# Altium footprint library PcbLib1_newsimcard.PcbLib: 28 footprints (part 2 of 2)
Each footprint in its own frame and in the unit in brackets; x right, y up, seen from the top. Pads: shape width x height; smd on the part's side, far side on the other; paste and mask are expansions set on the pad; w line width, h text height; cw(c..) or ccw(c..) is an arc to the next point about the centre after c.
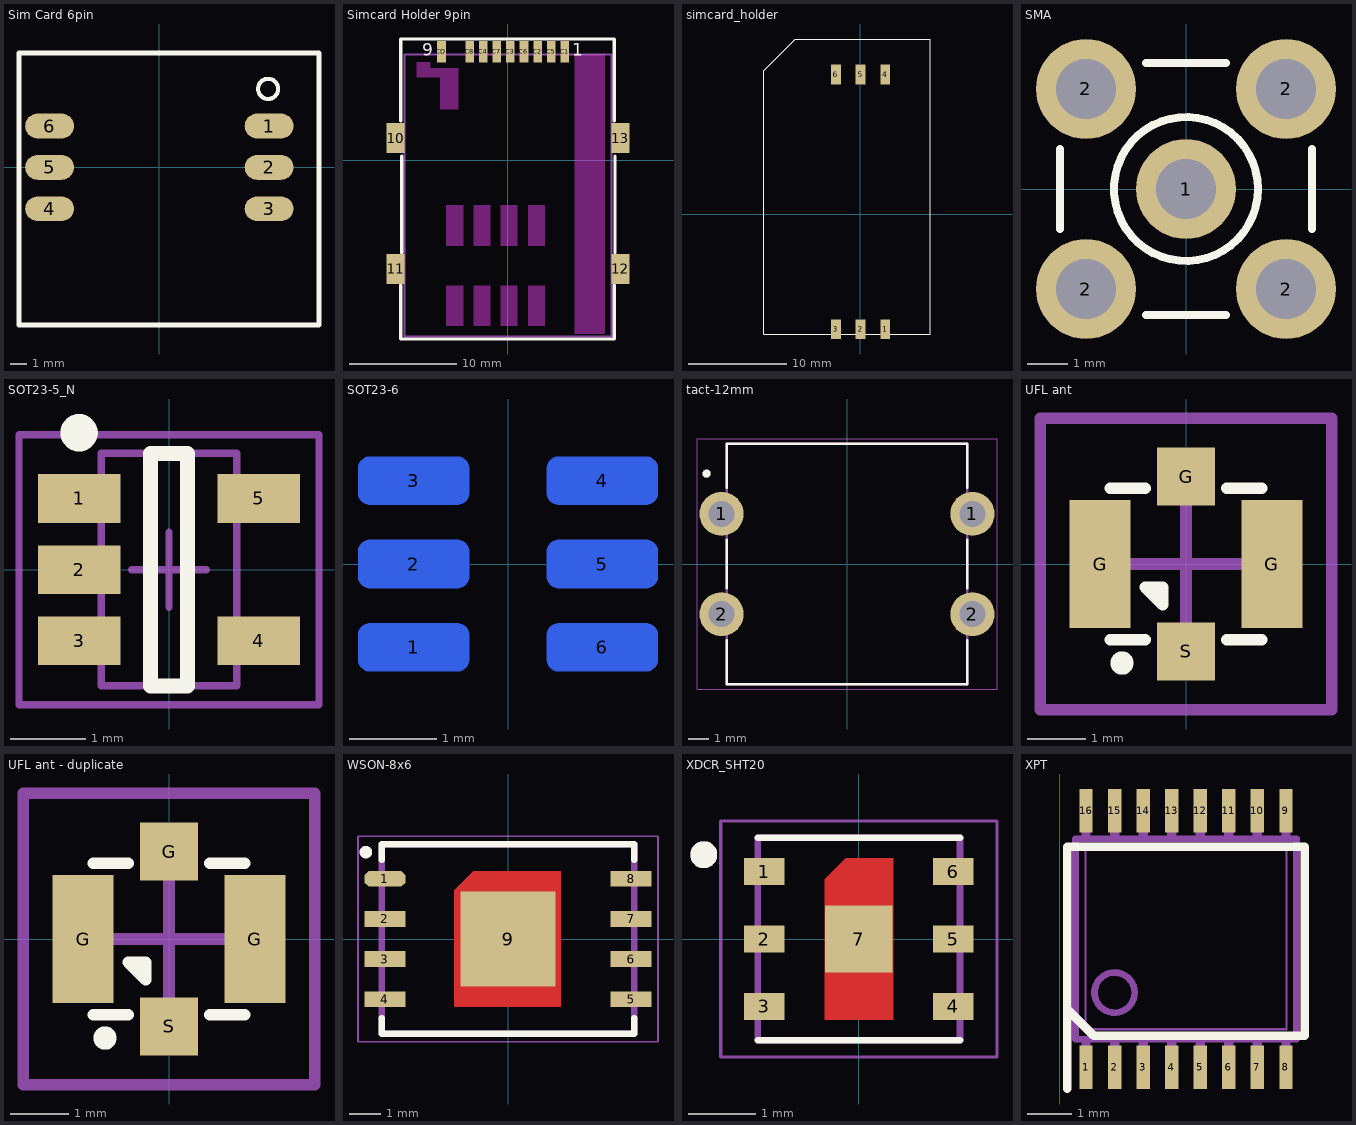
[diagram p1: the footprints below, top view; thin cyan lines are the x and y axes]

## Sim Card 6pin [mm]
pads (6):
  oval 3x1.524 smd: 1(6.74,2.54) 2(6.74,0) 3(6.74,-2.54) 4(-6.74,-2.54) 5(-6.74,0) 6(-6.74,2.54)
Top Overlay:
  circle w0.25: c6.68,4.823 r0.619
  lines w0.305: -8.62,-9.677 9.805,-9.677 9.805,7.023 -8.62,7.023 -8.62,-9.677
3D body "User Library-Sim Card Holder.STEP": height 1.8, standoff 0, extent -6.875,-9.55 9.425,6.85

## Simcard Holder 9pin [mm]
pads (13):
  rect 1.7x2.8 smd: 10(-10.5,2.075) 11(-10.5,-10.125) 12(10.5,-10.125) 13(10.5,2.075)
  rect 0.8x2 smd: C1(5.3,10.125) C2(2.76,10.125) C3(0.22,10.125) C4(-2.32,10.125) C5(4.03,10.125) C6(1.49,10.125) C7(-1.05,10.125) C8(-3.59,10.125) CD(-6.21,10.125)
Top Overlay:
  lines w0.3: -10,-11.625 -10,-16.675 9.925,-16.675 9.925,-11.625 ; -10,3.7 -10,11.325 9.925,11.325 9.925,3.7 ; -9.925,-8.625 -9.925,0.375 ; 10,-8.625 10,0.375
  text "9" at -8,9.325 h2
  text "1" at 6,9.325 h2
Keep-Out Layer:
  rectangle: -5.775,-7.975 -4.175,-4.175
  rectangle: -3.235,-7.975 -1.635,-4.175
  rectangle: -0.695,-7.975 0.905,-4.175
  rectangle: 1.845,-7.975 3.445,-4.175
  rectangle: 1.845,-15.475 3.445,-11.675
  rectangle: -0.695,-15.475 0.905,-11.675
  rectangle: -3.235,-15.475 -1.635,-11.675
  rectangle: -5.775,-15.475 -4.175,-11.675
  rectangle: 6.2,-16.225 9.075,9.875
  region: -8.525,9.175 -7.275,9.175 -7.275,8.575 -4.625,8.575 -4.625,6.675 -4.625,4.775 -6.325,4.775 -6.325,7.775 -8.525,7.775
Mechanical 1:
  lines w0.2: -9.65,-16.425 9.65,-16.425 9.65,9.875 -9.65,9.875 -9.65,-16.425
3D body "User Library-115A-ADA0-R02.STEP": height 1.8, standoff 0, extent -10.425,-16.1 10.525,10.9

## simcard_holder [mm]
pads (6):
  rect 1x2 smd: 1(2.521,-11.662) 2(0.021,-11.662) 3(-2.479,-11.662) 4(2.521,14.138) 5(0.021,14.138) 6(-2.479,14.138)
Top Overlay:
  lines w0.1: -9.779,-12.192 7.071,-12.192 7.071,17.738 -6.579,17.738 -7.379,16.938 -8.979,15.338 -9.779,14.538 -9.779,-12.192
3D body "User Library-SIM5060-6-0-26-01-A.STEP": height 2.6, standoff -0.7, extent -9.829,-11.932 7.371,17.708

## SMA [mm]
pads (5):
  round 2.5 hole 1.5: 1(0,0) 2(-2.5,-2.5) 2(-2.5,2.5) 2(2.5,-2.5) 2(2.5,2.5)
Top Overlay:
  circle w0.2: c0,0 r1.8
  lines w0.2: -3.15,-1 -3.15,1 ; -1,-3.15 1,-3.15 ; -1,3.15 1,3.15 ; 3.15,-1 3.15,1
Mechanical 1:
  circle w0.025: c0,0 r1.8
  circle w0.025: c0,0 r1.05
  circle w0.025: c0,0 r0.2
3D body "User Library-LNB.STEP": height 10.2, standoff -3.5, extent -3.25,-3.25 3.25,3.25

## SOT23-5_N [mm] "SOT23, 6-Leads, Body 2.9x1.6mm, Pitch 0.95mm, Lead Span 2.7mm, IPC Medium Density"
height 1.45
pads (5):
  rect 1.1x0.65 smd: 1(-1.2,0.95) 2(-1.2,0) 3(-1.2,-0.95) 4(1.2,-0.95) 5(1.2,0.95)
Top Overlay:
  circle w0.25: c-1.2,1.825 r0.125
  lines w0.2: -0.25,-1.55 -0.25,1.55 0.25,1.55 0.25,-1.55 -0.25,-1.55
Mechanical 13:
  lines w0.1: -0.9,-1.55 0.9,-1.55 0.9,1.55 -0.9,1.55 -0.9,-1.55
Mechanical 15:
  lines w0.1: -0.5,0 0.5,0 ; 0,-0.5 0,0.5 ; -2,-1.8 2,-1.8 2,1.8 -2,1.8 -2,-1.8
3D body: height 1.45, standoff 0, extent -0.9,-1.55 0.9,1.55

## SOT23-6 [mm]
pads (6):
  rrect50% 1.27x0.55 smd far side paste+0.038 mask+0.038: 1(-1.075,-0.95) 2(-1.075,0) 3(-1.075,0.95) 4(1.075,0.95) 5(1.075,0) 6(1.075,-0.95)
Bottom Overlay:
  circle w0.3: c-1.3,-1.525 r0.05
  lines w0.2: -0.9,-1.5 -0.9,-1.55 0.9,-1.55 0.9,-1.5 ; -0.9,1.5 -0.9,1.55 0.9,1.55 0.9,1.5
3D body "User Library-SOT23-6-2.STEP": height 1.45, standoff 0, extent -1.4,-1.45 1.4,1.45

## tact-12mm [mm]
pads (4):
  round 2.2 hole 1.3: 1(-6.25,2.5) 1(6.25,2.5) 2(-6.25,-2.5) 2(6.25,-2.5)
Top Overlay:
  circle w0.2: c-7,4.5 r0.1
  lines w0.127: -6,-3.8 -6,-6 6,-6 6,-3.8 ; -6,-1.205 -6,1.205 ; -6,3.795 -6,6 6,6 6,3.795 ; 6,-1.205 6,1.205
Mechanical 13:
  circle w0.2: c-7,4.5 r0.1
  lines w0.127: -6,-1 -6,1 ; 6,-1 6,1 ; -6,-6 -6,6 6,6 6,-6 -6,-6
Mechanical 15:
  lines w0.05: -7.475,-6.25 -7.475,6.25 7.475,6.25 7.475,-6.25 -7.475,-6.25
3D body "Tactile Push Button THT 12x12mm H8.50mm (Würth 430476085716).stp": height 8.35, standoff -3.57, extent -6.9,-5.975 7.105,6.025

## UFL ant [mm]
pads (4):
  rect 1.05x2.2 smd: G(-1.475,0) G(1.475,0)
  rect 1x1 smd: G(0,1.5) S(0,-1.5)
Top Overlay:
  circle w0.2: c-1.1,-1.7 r0.1
  lines w0.2: -1.3,-1.3 -0.7,-1.3 ; -1.3,1.3 -0.7,1.3 ; 0.7,-1.3 1.3,-1.3 ; 0.7,1.3 1.3,1.3 ; -0.7,-0.4 -0.4,-0.4 -0.4,-0.7 -0.7,-0.4
Mechanical 15:
  lines w0.2: -1,0 1,0 ; 0,-1 0,1 ; -2.5,-2.5 -2.5,2.5 2.5,2.5 2.5,-2.5 -2.5,-2.5
3D body "Molex 734120110.STEP": height 1.3, standoff 0, extent -1.5,-1.54 1.5,1.54

## UFL ant - duplicate [mm]
pads (4):
  rect 1.05x2.2 smd: G(-1.475,0) G(1.475,0)
  rect 1x1 smd: G(0,1.5) S(0,-1.5)
Top Overlay:
  circle w0.2: c-1.1,-1.7 r0.1
  lines w0.2: -1.3,-1.3 -0.7,-1.3 ; -1.3,1.3 -0.7,1.3 ; 0.7,-1.3 1.3,-1.3 ; 0.7,1.3 1.3,1.3 ; -0.7,-0.4 -0.4,-0.7 -0.4,-0.4 -0.7,-0.4
Mechanical 15:
  lines w0.2: -1,0 1,0 ; 0,-1 0,1 ; -2.5,-2.5 2.5,-2.5 2.5,2.5 -2.5,2.5 -2.5,-2.5
3D body "Molex 734120110.STEP": height 1.3, standoff 0, extent -1.5,-1.54 1.5,1.54

## WSON-8x6 [mm]
pads (9):
  oct 1.3x0.5 smd: 1(-3.895,1.905)
  rect 1.3x0.5 smd: 2(-3.895,0.635) 3(-3.895,-0.635) 4(-3.895,-1.905) 5(3.895,-1.905) 6(3.895,-0.635) 7(3.895,0.635) 8(3.895,1.905)
  rect 3x3 smd paste-3: 9(0,0)
Top Layer:
  region: 1.675,2.15 1.675,-2.15 -1.675,-2.15 -1.7,-2.125 -1.7,1.55 -1.1,2.15
Top Overlay:
  circle w0.2: c-4.5,2.75 r0.1
  lines w0.2: -4,-2.5 -4,-3 4,-3 4,-2.5 ; -4,2.5 -4,3 4,3 4,2.5
Top Paste:
  region: 1.075,-1.351 -1.076,-1.351 -1.076,1.35 1.075,1.35
Mechanical 13:
  lines w0.2: -4,-3 4,-3 4,3 -4,3 -4,-3
Mechanical 15:
  lines w0.05: -4.75,-3.25 4.75,-3.25 4.75,3.25 -4.75,3.25 -4.75,-3.25
3D body "step_temp.STEP": height 0.75, standoff -0.05, extent -4,-3 4,3

## XDCR_SHT20 [mm]
pads (7):
  rect 0.6x0.4 smd paste-1: 1(-1.4,1) 2(-1.4,0) 3(-1.4,-1) 4(1.4,-1) 5(1.4,0) 6(1.4,1)
  rect 1x1 smd paste-1 mask+0: 7(0,0)
Top Layer:
  region: 0.508,-1.2 -0.508,-1.2 -0.508,0.889 -0.197,1.2 0.508,1.2
Top Overlay:
  circle w0.2: c-2.3,1.25 r0.1
  lines w0.1: -1.5,-1.5 1.5,-1.5 ; -1.5,1.5 1.5,1.5
Top Paste:
  region: 0.7,-1.15 -0.7,-1.15 -0.7,0.875 -0.425,1.15 0.7,1.15
  region: 1.7,-1.2 1.2,-1.2 1.2,-0.8 1.7,-0.8
  region: 1.7,-0.2 1.2,-0.2 1.2,0.2 1.7,0.2
  region: 1.7,0.8 1.2,0.8 1.2,1.2 1.7,1.2
  region: -1.2,-1.2 -1.7,-1.2 -1.7,-0.8 -1.2,-0.8
  region: -1.2,-0.2 -1.7,-0.2 -1.7,0.2 -1.2,0.2
  region: -1.2,0.8 -1.7,0.8 -1.7,1.2 -1.2,1.2
Top Solder:
  region: 0.75,1.3 0.771,1.298 0.786,1.293 0.8,1.287 0.813,1.278 0.824,1.267 0.834,1.254 0.839,-1.245 0.831,-1.259 0.821,-1.271 0.809,-1.281 0.795,-1.289 0.781,-1.295 0.766,-1.299 0.75,-1.3 -0.75,-1.3 -0.766,-1.299 -0.781,-1.295 -0.795,-1.289 -0.809,-1.281 -0.821,-1.271 -0.831,-1.259 -0.839,-1.245 -0.845,-1.231 -0.849,-1.216 -0.85,-1.2 -0.85,0.9 -0.85,0.971 -0.521,1.3
Mechanical 13:
  circle w0.2: c-2.3,1.25 r0.1
  lines w0.1: -1.5,-1.5 1.5,-1.5 1.5,1.5 -1.5,1.5 -1.5,-1.5
Mechanical 15:
  lines w0.05: -2.05,-1.75 -2.05,1.75 2.05,1.75 2.05,-1.75 -2.05,-1.75

## XPT [mil]
pads (16):
  rect 12x39 smd: 1(23.38,65.21) 2(48.97,65.21) 3(74.56,65.21) 4(100.15,65.21) 5(125.74,65.21) 6(151.33,65.21) 7(176.92,65.21) 8(202.51,65.21) 9(202.51,294.96) 10(176.92,294.96) 11(151.33,294.96) 12(125.74,294.96) 13(100.15,294.96) 14(74.56,294.96) 15(48.97,294.96) 16(23.38,294.96)
Top Overlay:
  lines w7.87: 6.65,46.22 6.65,93.47 6.65,117.09 ; 6.65,117.09 6.65,262.76 219.24,262.76 219.24,93.47 30.27,93.47 6.65,117.09
Mechanical 13:
  circle w6: c48.94,132.08 r18
  region: 27.38,57.21 19.38,57.21 19.38,90.21 27.38,90.21
  region: 52.97,57.21 44.97,57.21 44.97,90.21 52.97,90.21
  region: 78.56,57.21 70.56,57.21 70.56,90.21 78.56,90.21
  region: 104.15,57.21 96.15,57.21 96.15,90.21 104.15,90.21
  region: 129.74,57.21 121.74,57.21 121.74,90.21 129.74,90.21
  region: 155.33,57.21 147.33,57.21 147.33,90.21 155.33,90.21
  region: 180.92,57.21 172.92,57.21 172.92,90.21 180.92,90.21
  region: 206.51,57.21 198.51,57.21 198.51,90.21 206.51,90.21
  region: 206.51,269.96 198.51,269.96 198.51,302.96 206.51,302.96
  region: 180.92,269.96 172.92,269.96 172.92,302.96 180.92,302.96
  region: 155.33,269.96 147.33,269.96 147.33,302.96 155.33,302.96
  region: 129.74,269.96 121.74,269.96 121.74,302.96 129.74,302.96
  region: 104.15,269.96 96.15,269.96 96.15,302.96 104.15,302.96
  region: 78.56,269.96 70.56,269.96 70.56,302.96 78.56,302.96
  region: 52.97,269.96 44.97,269.96 44.97,302.96 52.97,302.96
  region: 27.38,269.96 19.38,269.96 19.38,302.96 27.38,302.96
  lines w2: 22.94,99.21 202.94,99.21 202.94,260.96 22.94,260.96 22.94,99.21
  lines w6: 13.94,90.21 211.94,90.21 211.94,269.96 13.94,269.96 13.94,90.21